# Altium footprint library PCB_Library.PcbLib: 110 footprints (part 3 of 7)
Each footprint in its own frame and in the unit in brackets; x right, y up, seen from the top. Pads: shape width x height; smd on the part's side, far side on the other; paste and mask are expansions set on the pad; w line width, h text height; cw(c..) or ccw(c..) is an arc to the next point about the centre after c.
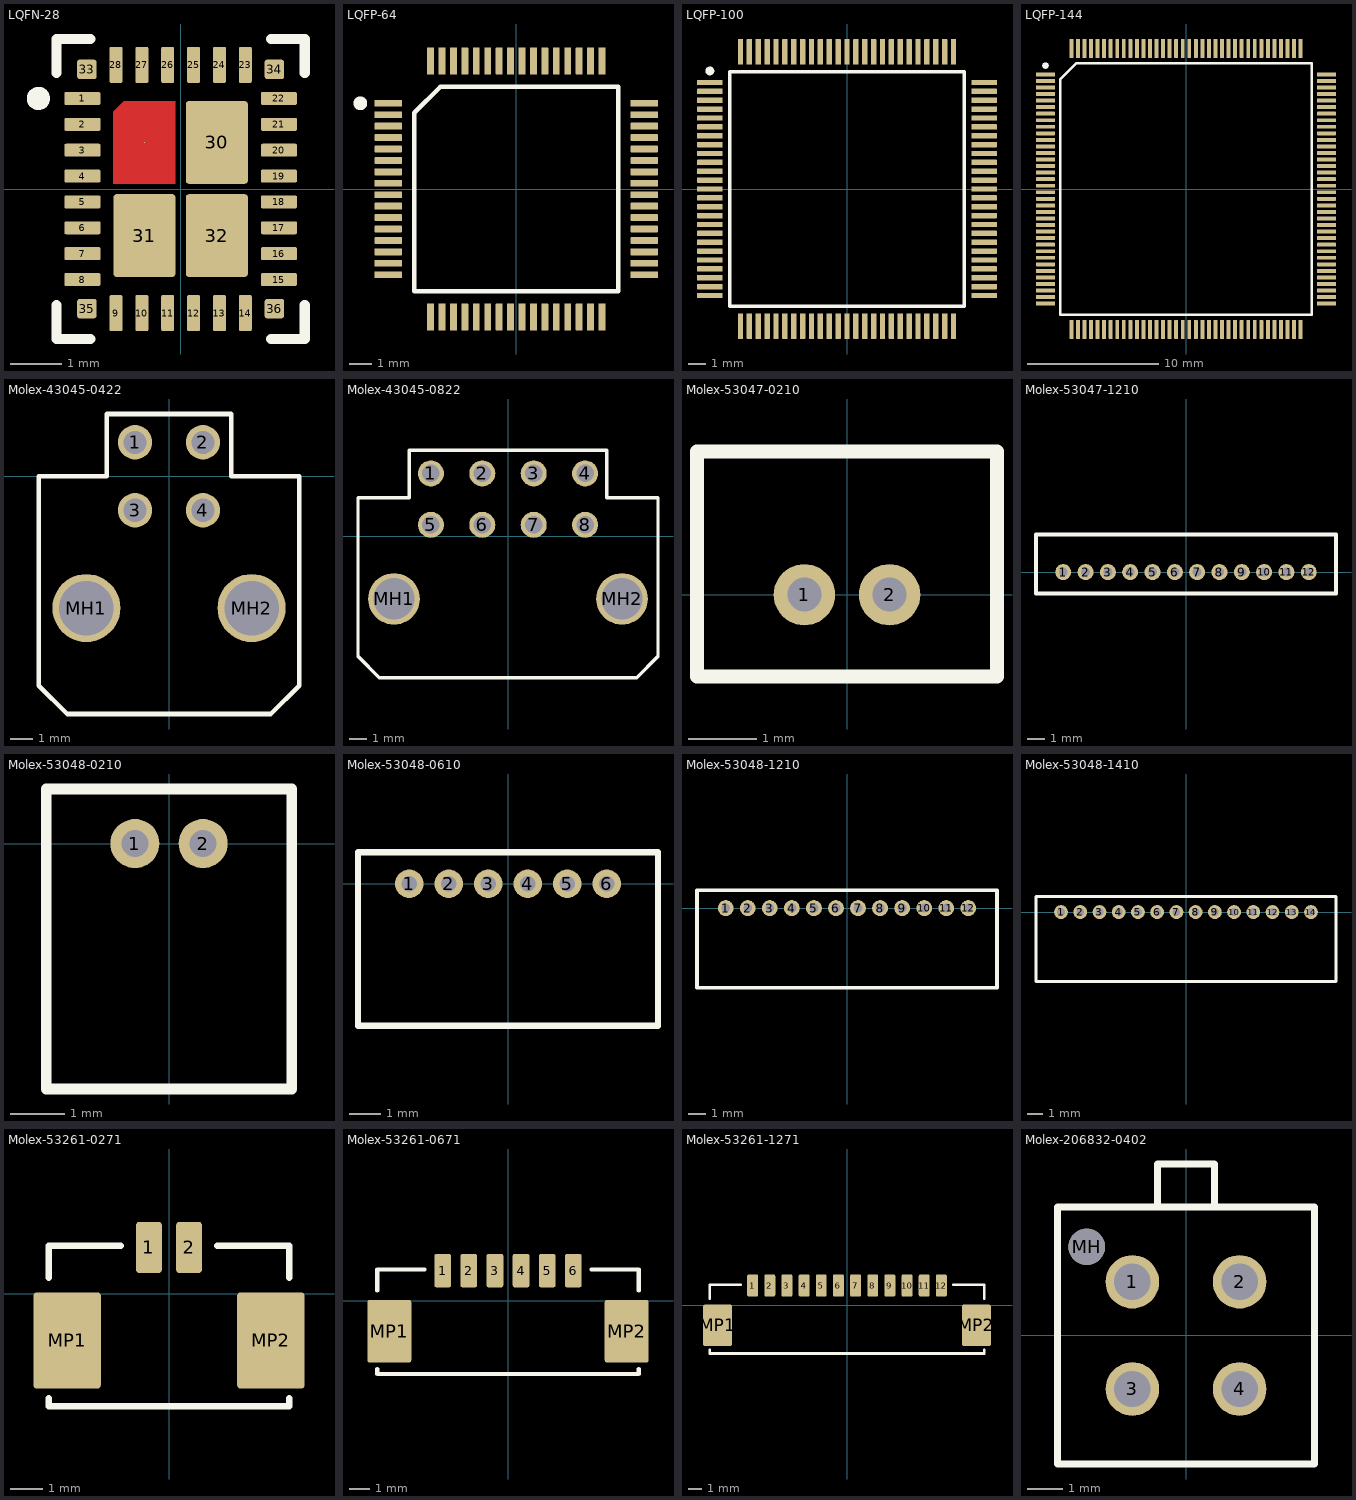
[diagram p2: the footprints below, top view; thin cyan lines are the x and y axes]

## LQFN-28 [mm]
pads (36):
  rrect25% 0.7x0.25 smd paste-0.05 mask+0.05: 1(-1.9,1.75) 2(-1.9,1.25) 3(-1.9,0.75) 4(-1.9,0.25) 5(-1.9,-0.25) 6(-1.9,-0.75) 7(-1.9,-1.25) 8(-1.9,-1.75) 15(1.9,-1.75) 16(1.9,-1.25) 17(1.9,-0.75) 18(1.9,-0.25) 19(1.9,0.25) 20(1.9,0.75) 21(1.9,1.25) 22(1.9,1.75)
  rrect25% 0.25x0.7 smd paste-0.05 mask+0.05: 9(-1.25,-2.4) 10(-0.75,-2.4) 11(-0.25,-2.4) 12(0.25,-2.4) 13(0.75,-2.4) 14(1.25,-2.4) 23(1.25,2.4) 24(0.75,2.4) 25(0.25,2.4) 26(-0.25,2.4) 27(-0.75,2.4) 28(-1.25,2.4)
  round 0.025 smd paste-0.05 mask+0.05: 29(-0.7,0.9)
  rrect10% 1.2x1.6 smd paste-0.05 mask+0.05: 30(0.7,0.9) 31(-0.7,-0.9) 32(0.7,-0.9)
  rrect25% 0.375x0.375 smd paste-0.05 mask+0.05: 33(-1.813,2.312) 34(1.813,2.312) 35(-1.813,-2.312) 36(1.813,-2.312)
Top Layer:
  region: -1.3,0.1 -0.1,0.1 -0.1,1.7 -1.096,1.7 -1.3,1.496
Top Overlay:
  circle w0.25: c-2.75,1.75 r0.1
  lines w0.2: -2.4,-2.25 -2.4,-2.9 -1.75,-2.9 ; -2.4,2.25 -2.4,2.9 -1.75,2.9 ; 1.75,-2.9 2.4,-2.9 2.4,-2.25 ; 1.75,2.9 2.4,2.9 2.4,2.25
3D body "IC_Analog_Devices_LTC7151SEV#PBF_eec.STEP": height 0.25, standoff 0, extent -2.35,-2.85 2.35,2.85

## LQFP-64 [mm]
pads (64):
  rrect25% 1.2x0.3 smd paste-0.05 mask+0.05: 1(-5.6,3.75) 2(-5.6,3.25) 3(-5.6,2.75) 4(-5.6,2.25) 5(-5.6,1.75) 6(-5.6,1.25) 7(-5.6,0.75) 8(-5.6,0.25) 9(-5.6,-0.25) 10(-5.6,-0.75) 11(-5.6,-1.25) 12(-5.6,-1.75) 13(-5.6,-2.25) 14(-5.6,-2.75) 15(-5.6,-3.25) 16(-5.6,-3.75) 33(5.6,-3.75) 34(5.6,-3.25) 35(5.6,-2.75) 36(5.6,-2.25) 37(5.6,-1.75) 38(5.6,-1.25) 39(5.6,-0.75) 40(5.6,-0.25) 41(5.6,0.25) 42(5.6,0.75) 43(5.6,1.25) 44(5.6,1.75) 45(5.6,2.25) 46(5.6,2.75) 47(5.6,3.25) 48(5.6,3.75)
  rrect25% 0.3x1.2 smd paste-0.05 mask+0.05: 17(-3.75,-5.6) 18(-3.25,-5.6) 19(-2.75,-5.6) 20(-2.25,-5.6) 21(-1.75,-5.6) 22(-1.25,-5.6) 23(-0.75,-5.6) 24(-0.25,-5.6) 25(0.25,-5.6) 26(0.75,-5.6) 27(1.25,-5.6) 28(1.75,-5.6) 29(2.25,-5.6) 30(2.75,-5.6) 31(3.25,-5.6) 32(3.75,-5.6) 49(3.75,5.6) 50(3.25,5.6) 51(2.75,5.6) 52(2.25,5.6) 53(1.75,5.6) 54(1.25,5.6) 55(0.75,5.6) 56(0.25,5.6) 57(-0.25,5.6) 58(-0.75,5.6) 59(-1.25,5.6) 60(-1.75,5.6) 61(-2.25,5.6) 62(-2.75,5.6) 63(-3.25,5.6) 64(-3.75,5.6)
Top Overlay:
  circle w0.4: c-6.825,3.75 r0.1
  lines w0.2: -4.465,-4.465 -4.465,3.33 -3.33,4.465 4.465,4.465 4.465,-4.465 -4.465,-4.465
3D body "User Library-STM32Fxxx -LQFP64 10mm x 10mm.STEP": height 1.6, standoff 0.01, extent -5.999,-5.999 5.999,5.999

## LQFP-100 [mm]
height 1.6
pads (100):
  rrect25% 1.45x0.3 smd paste-0.025 mask+0.05: 1(-7.725,6) 2(-7.725,5.5) 3(-7.725,5) 4(-7.725,4.5) 5(-7.725,4) 6(-7.725,3.5) 7(-7.725,3) 8(-7.725,2.5) 9(-7.725,2) 10(-7.725,1.5) 11(-7.725,1) 12(-7.725,0.5) 13(-7.725,0) 14(-7.725,-0.5) 15(-7.725,-1) 16(-7.725,-1.5) 17(-7.725,-2) 18(-7.725,-2.5) 19(-7.725,-3) 20(-7.725,-3.5) 21(-7.725,-4) 22(-7.725,-4.5) 23(-7.725,-5) 24(-7.725,-5.5) 25(-7.725,-6) 51(7.725,-6) 52(7.725,-5.5) 53(7.725,-5) 54(7.725,-4.5) 55(7.725,-4) 56(7.725,-3.5) 57(7.725,-3) 58(7.725,-2.5) 59(7.725,-2) 60(7.725,-1.5) 61(7.725,-1) 62(7.725,-0.5) 63(7.725,0) 64(7.725,0.5) 65(7.725,1) 66(7.725,1.5) 67(7.725,2) 68(7.725,2.5) 69(7.725,3) 70(7.725,3.5) 71(7.725,4) 72(7.725,4.5) 73(7.725,5) 74(7.725,5.5) 75(7.725,6)
  rrect25% 0.3x1.45 smd paste-0.025 mask+0.05: 26(-6,-7.725) 27(-5.5,-7.725) 28(-5,-7.725) 29(-4.5,-7.725) 30(-4,-7.725) 31(-3.5,-7.725) 32(-3,-7.725) 33(-2.5,-7.725) 34(-2,-7.725) 35(-1.5,-7.725) 36(-1,-7.725) 37(-0.5,-7.725) 38(0,-7.725) 39(0.5,-7.725) 40(1,-7.725) 41(1.5,-7.725) 42(2,-7.725) 43(2.5,-7.725) 44(3,-7.725) 45(3.5,-7.725) 46(4,-7.725) 47(4.5,-7.725) 48(5,-7.725) 49(5.5,-7.725) 50(6,-7.725) 76(6,7.725) 77(5.5,7.725) 78(5,7.725) 79(4.5,7.725) 80(4,7.725) 81(3.5,7.725) 82(3,7.725) 83(2.5,7.725) 84(2,7.725) 85(1.5,7.725) 86(1,7.725) 87(0.5,7.725) 88(0,7.725) 89(-0.5,7.725) 90(-1,7.725) 91(-1.5,7.725) 92(-2,7.725) 93(-2.5,7.725) 94(-3,7.725) 95(-3.5,7.725) 96(-4,7.725) 97(-4.5,7.725) 98(-5,7.725) 99(-5.5,7.725) 100(-6,7.725)
Top Overlay:
  circle w0.25: c-7.725,6.65 r0.125
  lines w0.2: -6.6,-6.6 -6.6,6.6 6.6,6.6 6.6,-6.6 -6.6,-6.6
3D body "STM32H723VETx.STEP": height 1.65, standoff -0.02, extent -8,-8 8,8

## LQFP-144 [mm]
height 1.6
pads (144):
  rrect25% 1.45x0.3 smd paste-0.05 mask+0.05: 1(-10.725,8.75) 2(-10.725,8.25) 3(-10.725,7.75) 4(-10.725,7.25) 5(-10.725,6.75) 6(-10.725,6.25) 7(-10.725,5.75) 8(-10.725,5.25) 9(-10.725,4.75) 10(-10.725,4.25) 11(-10.725,3.75) 12(-10.725,3.25) 13(-10.725,2.75) 14(-10.725,2.25) 15(-10.725,1.75) 16(-10.725,1.25) 17(-10.725,0.75) 18(-10.725,0.25) 19(-10.725,-0.25) 20(-10.725,-0.75) 21(-10.725,-1.25) 22(-10.725,-1.75) 23(-10.725,-2.25) 24(-10.725,-2.75) 25(-10.725,-3.25) 26(-10.725,-3.75) 27(-10.725,-4.25) 28(-10.725,-4.75) 29(-10.725,-5.25) 30(-10.725,-5.75) 31(-10.725,-6.25) 32(-10.725,-6.75) 33(-10.725,-7.25) 34(-10.725,-7.75) 35(-10.725,-8.25) 36(-10.725,-8.75) 73(10.725,-8.75) 74(10.725,-8.25) 75(10.725,-7.75) 76(10.725,-7.25) 77(10.725,-6.75) 78(10.725,-6.25) 79(10.725,-5.75) 80(10.725,-5.25) 81(10.725,-4.75) 82(10.725,-4.25) 83(10.725,-3.75) 84(10.725,-3.25) 85(10.725,-2.75) 86(10.725,-2.25) 87(10.725,-1.75) 88(10.725,-1.25) 89(10.725,-0.75) 90(10.725,-0.25) 91(10.725,0.25) 92(10.725,0.75) 93(10.725,1.25) 94(10.725,1.75) 95(10.725,2.25) 96(10.725,2.75) 97(10.725,3.25) 98(10.725,3.75) 99(10.725,4.25) 100(10.725,4.75) 101(10.725,5.25) 102(10.725,5.75) 103(10.725,6.25) 104(10.725,6.75) 105(10.725,7.25) 106(10.725,7.75) 107(10.725,8.25) 108(10.725,8.75)
  rrect25% 0.3x1.45 smd paste-0.05 mask+0.05: 37(-8.75,-10.725) 38(-8.25,-10.725) 39(-7.75,-10.725) 40(-7.25,-10.725) 41(-6.75,-10.725) 42(-6.25,-10.725) 43(-5.75,-10.725) 44(-5.25,-10.725) 45(-4.75,-10.725) 46(-4.25,-10.725) 47(-3.75,-10.725) 48(-3.25,-10.725) 49(-2.75,-10.725) 50(-2.25,-10.725) 51(-1.75,-10.725) 52(-1.25,-10.725) 53(-0.75,-10.725) 54(-0.25,-10.725) 55(0.25,-10.725) 56(0.75,-10.725) 57(1.25,-10.725) 58(1.75,-10.725) 59(2.25,-10.725) 60(2.75,-10.725) 61(3.25,-10.725) 62(3.75,-10.725) 63(4.25,-10.725) 64(4.75,-10.725) 65(5.25,-10.725) 66(5.75,-10.725) 67(6.25,-10.725) 68(6.75,-10.725) 69(7.25,-10.725) 70(7.75,-10.725) 71(8.25,-10.725) 72(8.75,-10.725) 109(8.75,10.725) 110(8.25,10.725) 111(7.75,10.725) 112(7.25,10.725) 113(6.75,10.725) 114(6.25,10.725) 115(5.75,10.725) 116(5.25,10.725) 117(4.75,10.725) 118(4.25,10.725) 119(3.75,10.725) 120(3.25,10.725) 121(2.75,10.725) 122(2.25,10.725) 123(1.75,10.725) 124(1.25,10.725) 125(0.75,10.725) 126(0.25,10.725) 127(-0.25,10.725) 128(-0.75,10.725) 129(-1.25,10.725) 130(-1.75,10.725) 131(-2.25,10.725) 132(-2.75,10.725) 133(-3.25,10.725) 134(-3.75,10.725) 135(-4.25,10.725) 136(-4.75,10.725) 137(-5.25,10.725) 138(-5.75,10.725) 139(-6.25,10.725) 140(-6.75,10.725) 141(-7.25,10.725) 142(-7.75,10.725) 143(-8.25,10.725) 144(-8.75,10.725)
Top Overlay:
  circle w0.25: c-10.725,9.425 r0.125
  lines w0.2: -9.6,-9.6 9.6,-9.6 9.6,9.6 -8.375,9.6 -9.6,8.375 -9.6,-9.6
3D body "IC_STMicroelectronics_STM32F446ZET6_eec.STEP": height 1.6, standoff 0, extent -11.01,-11.01 11.01,11.01

## Molex-43045-0422 [mm]
pads (6):
  round 1.52 hole 1.02 mask+0.05: 1(-1.5,1.5) 2(1.5,1.5) 3(-1.5,-1.5) 4(1.5,-1.5)
  round 3.01 hole 2.41 mask+0.05: MH1(-3.65,-5.82) MH2(3.65,-5.82)
Top Overlay:
  lines w0.2: -5.75,-9.25 -5.75,0 -2.75,0 -2.75,2.75 2.75,2.75 2.75,0 5.75,0 5.75,-9.25 4.5,-10.5 -4.5,-10.5 -5.75,-9.25
3D body "430450422.stp": height 8.78, standoff -3.17, extent -5.125,-10.455 5.075,1.785

## Molex-43045-0822 [mm]
pads (10):
  round 1.52 hole 1.02 mask+0.05: 1(-4.5,3.66) 2(-1.5,3.66) 3(1.5,3.66) 4(4.5,3.66) 5(-4.5,0.66) 6(-1.5,0.66) 7(1.5,0.66) 8(4.5,0.66)
  round 3.01 hole 2.41 mask+0.05: MH1(-6.65,-3.66) MH2(6.65,-3.66)
Top Overlay:
  lines w0.2: -7.5,-8.25 -7.5,-8.25 ; -7.5,-8.25 -8.75,-7 -8.75,2.25 -5.75,2.25 -5.75,5 5.75,5 5.75,2.25 8.75,2.25 8.75,-7 7.5,-8.25 -7.5,-8.25
3D body "430450822.stp": height 8.78, standoff -3.17, extent -8.125,-8.255 8.075,3.985

## Molex-53047-0210 [mm]
pads (2):
  round 0.9 hole 0.5 mask+0.05: 1(-0.625,0) 2(0.625,0)
Top Overlay:
  lines w0.2: -2.2,-1.2 2.2,-1.2 2.2,2.1 -2.2,2.1 -2.2,-1.2
3D body "530470210.stp": height 4.21, standoff -2.29, extent -2.125,-1.15 2.125,2.05

## Molex-53047-1210 [mm]
pads (12):
  round 0.9 hole 0.5 mask+0.05: 1(-6.875,0) 2(-5.625,0) 3(-4.375,0) 4(-3.125,0) 5(-1.875,0) 6(-0.625,0) 7(0.625,0) 8(1.875,0) 9(3.125,0) 10(4.375,0) 11(5.625,0) 12(6.875,0)
Top Overlay:
  lines w0.2: -8.4,-1.2 8.4,-1.2 8.4,2.1 -8.4,2.1 -8.4,-1.2
3D body "530471210.stp": height 4.21, standoff -2.29, extent -8.375,-1.15 8.375,2.05

## Molex-53048-0210 [mm]
pads (2):
  round 0.9 hole 0.5 mask+0.05: 1(-0.625,0) 2(0.625,0)
Top Overlay:
  lines w0.2: -2.25,-4.5 -2.25,1 2.25,1 2.25,-4.5 -2.25,-4.5
3D body "530480210.stp": height 3.2, standoff -2.6, extent -2.125,-4.45 2.125,1.05

## Molex-53048-0610 [mm]
pads (6):
  round 0.9 hole 0.5 mask+0.05: 1(-3.125,0) 2(-1.875,0) 3(-0.625,0) 4(0.625,0) 5(1.875,0) 6(3.125,0)
Top Overlay:
  lines w0.2: -4.75,-4.5 4.75,-4.5 4.75,1 -4.75,1 -4.75,-4.5
3D body "530480610.stp": height 3.2, standoff -2.6, extent -4.625,-4.45 4.625,1.05

## Molex-53048-1210 [mm]
pads (12):
  round 0.9 hole 0.5 mask+0.05: 1(-6.875,0) 2(-5.625,0) 3(-4.375,0) 4(-3.125,0) 5(-1.875,0) 6(-0.625,0) 7(0.625,0) 8(1.875,0) 9(3.125,0) 10(4.375,0) 11(5.625,0) 12(6.875,0)
Top Overlay:
  lines w0.2: -8.5,-4.5 8.5,-4.5 8.5,1 -8.5,1 -8.5,-4.5
3D body "530481210.stp": height 3.2, standoff -2.6, extent -8.375,-4.45 8.375,1.05

## Molex-53048-1410 [mm]
pads (14):
  round 0.9 hole 0.5 mask+0.05: 1(-8.125,0) 2(-6.875,0) 3(-5.625,0) 4(-4.375,0) 5(-3.125,0) 6(-1.875,0) 7(-0.625,0) 8(0.625,0) 9(1.875,0) 10(3.125,0) 11(4.375,0) 12(5.625,0) 13(6.875,0) 14(8.125,0)
Top Overlay:
  lines w0.2: -9.75,-4.5 -9.75,1 9.75,1 9.75,-4.5 -9.75,-4.5
3D body "530481410.stp": height 3.2, standoff -2.6, extent -9.625,-4.45 9.625,1.05

## Molex-53261-0271 [mm]
pads (4):
  rrect25% 0.8x1.6 smd paste-0.05 mask+0.05: 1(-0.625,1.45) 2(0.625,1.45)
  rrect10% 2.1x3 smd paste-0.05 mask+0.05: MP1(-3.175,-1.45) MP2(3.175,-1.45)
Top Overlay:
  lines w0.2: -3.75,-3.25 -3.75,-3.5 3.75,-3.5 3.75,-3.25 ; -3.75,0.5 -3.75,1.5 -1.5,1.5 ; 1.5,1.5 3.75,1.5 3.75,0.5
3D body "532610271.stp": height 3.41, standoff 0.01, extent -3.825,-3.5 3.825,1.7

## Molex-53261-0671 [mm]
pads (8):
  rrect25% 0.8x1.6 smd paste-0.05 mask+0.05: 1(-3.125,1.45) 2(-1.875,1.45) 3(-0.625,1.45) 4(0.625,1.45) 5(1.875,1.45) 6(3.125,1.45)
  rrect10% 2.1x3 smd paste-0.05 mask+0.05: MP1(-5.675,-1.45) MP2(5.675,-1.45)
Top Overlay:
  lines w0.2: -6.25,-3.25 -6.25,-3.5 6.25,-3.5 6.25,-3.25 ; -6.25,0.5 -6.25,1.5 -4,1.5 ; 4,1.5 6.25,1.5 6.25,0.5
3D body "532610671.stp": height 3.41, standoff 0.01, extent -6.325,-3.5 6.325,1.7

## Molex-53261-1271 [mm]
pads (14):
  rrect25% 0.8x1.6 smd paste-0.05 mask+0.05: 1(-6.875,1.45) 2(-5.625,1.45) 3(-4.375,1.45) 4(-3.125,1.45) 5(-1.875,1.45) 6(-0.625,1.45) 7(0.625,1.45) 8(1.875,1.45) 9(3.125,1.45) 10(4.375,1.45) 11(5.625,1.45) 12(6.875,1.45)
  rrect10% 2.1x3 smd paste-0.05 mask+0.05: MP1(-9.425,-1.45) MP2(9.425,-1.45)
Top Overlay:
  lines w0.2: -10,-3.25 -10,-3.5 10,-3.5 10,-3.25 ; -10,0.5 -10,1.5 -7.75,1.5 ; 7.75,1.5 10,1.5 10,0.5
3D body "532611271.stp": height 3.41, standoff 0.01, extent -10.075,-3.5 10.075,1.7

## Molex-206832-0402 [mm]
pads (5):
  round 1.5 hole 1.02 mask+0.05: 1(-1.5,1.5) 2(1.5,1.5) 3(-1.5,-1.5) 4(1.5,-1.5)
  round 1.02 hole 1.02 unplated mask+0.05: MH(-2.78,2.48)
Top Overlay:
  lines w0.2: -0.8,3.6 -0.8,4.8 0,4.8 0.8,4.8 0.8,3.6 ; -3.6,-3.6 -3.6,3.6 3.6,3.6 3.6,-3.6 -3.6,-3.6
3D body "2068320402.stp": height 9.92, standoff -3.17, extent -3.425,-3.43 3.425,4.83